# Altium footprint library HDR2.54.PcbLib: 242 footprints (part 16 of 16)
Each footprint in its own frame and in the unit in brackets; x right, y up, seen from the top. Pads: shape width x height; smd on the part's side, far side on the other; paste and mask are expansions set on the pad; w line width, h text height; cw(c..) or ccw(c..) is an arc to the next point about the centre after c.
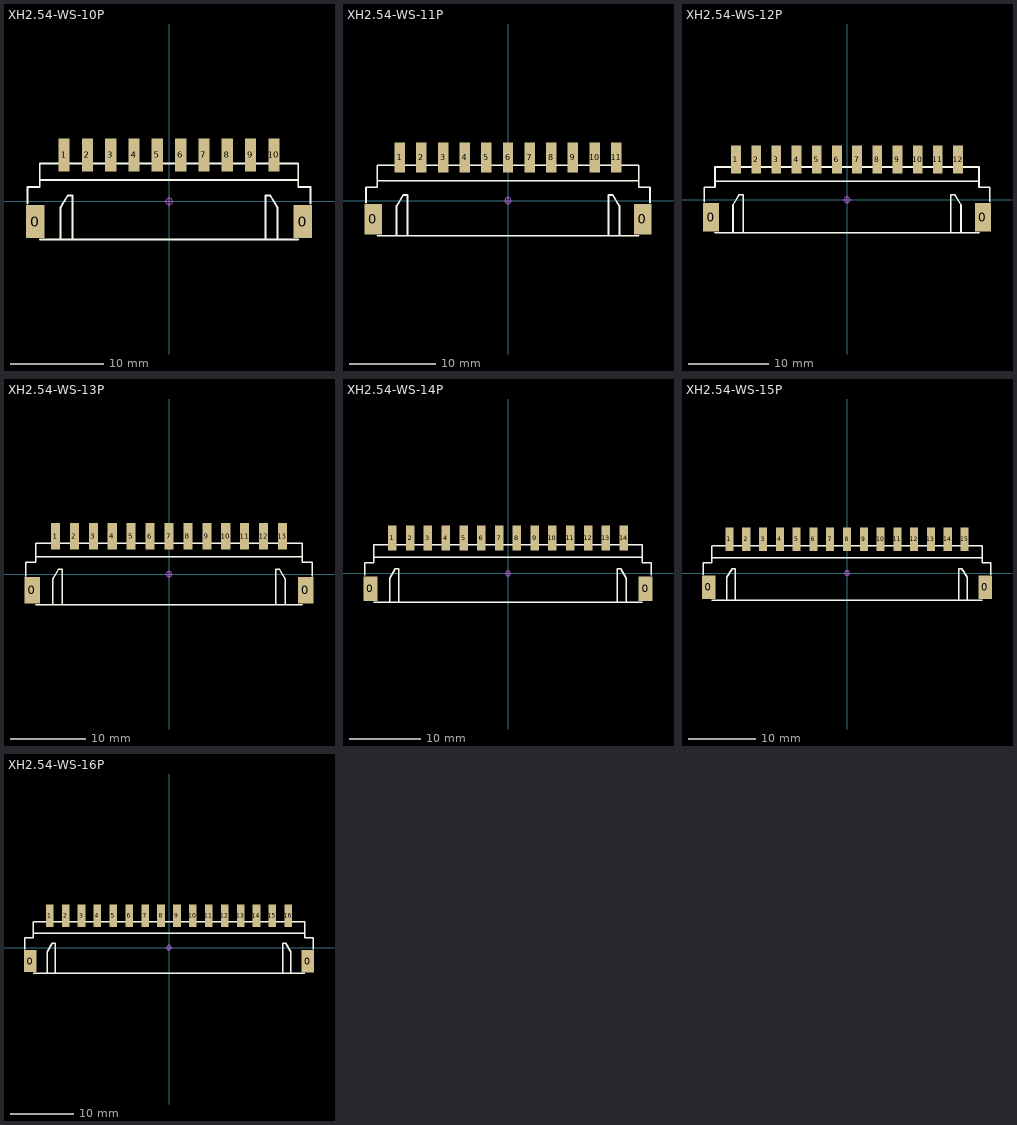
[diagram p15: the footprints below, top view; thin cyan lines are the x and y axes]

## XH2.54-WS-10P [mm] "����30mm�����8mm���ߣ�6.1mm"
pads (12):
  rect 2x3.5 smd: 0(-14.327,-2.15) 0(14.327,-2.15)
  rect 1.2x3.5 smd: 1(-11.25,4.981) 2(-8.75,4.981) 3(-6.25,4.981) 4(-3.75,4.981) 5(-1.25,4.981) 6(1.25,4.981) 7(3.75,4.981) 8(6.25,4.981) 9(8.75,4.981) 10(11.25,4.981)
Top Overlay:
  lines w0.2: -15.16,-0.254 -15.16,1.536 -13.85,1.536 -13.85,4.064 13.85,4.064 13.85,1.536 15.16,1.536 15.16,-0.254 ; -13.85,-4.064 13.85,-4.064 ; -13.85,2.286 13.85,2.286 ; -11.62,-4.064 -11.62,-0.634 -10.858,0.636 -10.35,0.636 -10.35,-4.064 ; 10.35,-4.064 10.35,0.636 10.858,0.636 11.62,-0.634 11.62,-4.064
Mechanical 15:
  circle w0.05: c0,0 r0.35
  lines w0.05: -0.5,0 0.5,0 ; 0,-0.5 0,0.5
3D body "XH2.54-WS-10P.STEP": height 6.05, standoff -0.01, extent -15,-4 15,6.418

## XH2.54-WS-11P [mm] "����32.5mm�����8mm���ߣ�6.1mm"
pads (13):
  rect 2x3.5 smd: 0(-15.577,-2.15) 0(15.577,-2.15)
  rect 1.2x3.5 smd: 1(-12.5,4.981) 2(-10,4.981) 3(-7.5,4.981) 4(-5,4.981) 5(-2.5,4.981) 6(0,4.981) 7(2.5,4.981) 8(5,4.981) 9(7.5,4.981) 10(10,4.981) 11(12.5,4.981)
Top Overlay:
  lines w0.2: -16.41,-0.254 -16.41,1.536 -15.1,1.536 -15.1,4.064 15.1,4.064 15.1,1.536 16.41,1.536 16.41,-0.254 ; -15.1,-4.064 15.1,-4.064 ; -15.1,2.286 15.1,2.286 ; -12.87,-4.064 -12.87,-0.634 -12.108,0.636 -11.6,0.636 -11.6,-4.064 ; 11.6,-4.064 11.6,0.636 12.108,0.636 12.87,-0.634 12.87,-4.064
Mechanical 15:
  circle w0.05: c0,0 r0.35
  lines w0.05: -0.5,0 0.5,0 ; 0,-0.5 0,0.5
3D body "XH2.54-WS-11P.STEP": height 6.05, standoff -0.01, extent -16.25,-4 16.25,6.418

## XH2.54-WS-12P [mm] "����35mm�����8mm���ߣ�6.1mm"
pads (14):
  rect 2x3.5 smd: 0(-16.827,-2.15) 0(16.827,-2.15)
  rect 1.2x3.5 smd: 1(-13.75,4.981) 2(-11.25,4.981) 3(-8.75,4.981) 4(-6.25,4.981) 5(-3.75,4.981) 6(-1.25,4.981) 7(1.25,4.981) 8(3.75,4.981) 9(6.25,4.981) 10(8.75,4.981) 11(11.25,4.981) 12(13.75,4.981)
Top Overlay:
  lines w0.2: -17.66,-0.254 -17.66,1.536 -16.35,1.536 -16.35,4.064 16.35,4.064 16.35,1.536 17.66,1.536 17.66,-0.254 ; -16.35,-4.064 16.35,-4.064 ; -16.35,2.286 16.35,2.286 ; -14.12,-4.064 -14.12,-0.634 -13.358,0.636 -12.85,0.636 -12.85,-4.064 ; 12.85,-4.064 12.85,0.636 13.358,0.636 14.12,-0.634 14.12,-4.064
Mechanical 15:
  circle w0.05: c0,0 r0.35
  lines w0.05: -0.5,0 0.5,0 ; 0,-0.5 0,0.5
3D body "XH2.54-WS-12.P.STEP": height 6.05, standoff -0.01, extent -17.5,-4 17.5,6.418

## XH2.54-WS-13P [mm] "����37.5mm�����8mm���ߣ�6.1mm"
pads (15):
  rect 2x3.5 smd: 0(-18.077,-2.15) 0(18.077,-2.15)
  rect 1.2x3.5 smd: 1(-15,4.981) 2(-12.5,4.981) 3(-10,4.981) 4(-7.5,4.981) 5(-5,4.981) 6(-2.5,4.981) 7(0,4.981) 8(2.5,4.981) 9(5,4.981) 10(7.5,4.981) 11(10,4.981) 12(12.5,4.981) 13(15,4.981)
Top Overlay:
  lines w0.2: -18.91,-0.254 -18.91,1.536 -17.6,1.536 -17.6,4.064 17.6,4.064 17.6,1.536 18.91,1.536 18.91,-0.254 ; -17.6,-4.064 17.6,-4.064 ; -17.6,2.286 17.6,2.286 ; -15.37,-4.064 -15.37,-0.634 -14.608,0.636 -14.1,0.636 -14.1,-4.064 ; 14.1,-4.064 14.1,0.636 14.608,0.636 15.37,-0.634 15.37,-4.064
Mechanical 15:
  circle w0.05: c0,0 r0.35
  lines w0.05: -0.5,0 0.5,0 ; 0,-0.5 0,0.5
3D body "XH2.54-WS-13.P.STEP": height 6.05, standoff -0.01, extent -18.75,-4 18.75,6.418

## XH2.54-WS-14P [mm] "����40mm�����8mm���ߣ�6.1mm"
pads (16):
  rect 2x3.5 smd: 0(-19.327,-2.15) 0(19.327,-2.15)
  rect 1.2x3.5 smd: 1(-16.25,4.981) 2(-13.75,4.981) 3(-11.25,4.981) 4(-8.75,4.981) 5(-6.25,4.981) 6(-3.75,4.981) 7(-1.25,4.981) 8(1.25,4.981) 9(3.75,4.981) 10(6.25,4.981) 11(8.75,4.981) 12(11.25,4.981) 13(13.75,4.981) 14(16.25,4.981)
Top Overlay:
  lines w0.2: -20.16,-0.254 -20.16,1.536 -18.85,1.536 -18.85,4.064 18.85,4.064 18.85,1.536 20.16,1.536 20.16,-0.254 ; -18.85,-4.064 18.85,-4.064 ; -18.85,2.286 18.85,2.286 ; -16.62,-4.064 -16.62,-0.634 -15.858,0.636 -15.35,0.636 -15.35,-4.064 ; 15.35,-4.064 15.35,0.636 15.858,0.636 16.62,-0.634 16.62,-4.064
Mechanical 15:
  circle w0.05: c0,0 r0.35
  lines w0.05: -0.5,0 0.5,0 ; 0,-0.5 0,0.5
3D body "XH2.54-WS-14.P.STEP": height 6.05, standoff -0.01, extent -20,-4 20,6.418

## XH2.54-WS-15P [mm] "����42.5mm�����8mm���ߣ�6.1mm �Ա�ID:�ƾ���ʯ   ������ַ:https://shop463601444.taobao.com"
pads (17):
  rect 2x3.5 smd: 0(-20.577,-2.131) 0(20.577,-2.15)
  rect 1.2x3.5 smd: 1(-17.5,5) 2(-15,5) 3(-12.5,5) 4(-10,5) 5(-7.5,5) 6(-5,5) 7(-2.5,5) 8(0,5) 9(2.5,5) 10(5,5) 11(7.5,5) 12(10,5) 13(12.5,5) 14(15,5) 15(17.5,5)
Top Overlay:
  lines w0.2: -21.41,-0.254 -21.41,1.536 -20.1,1.536 -20.1,4.064 ; -20.1,-4.064 20.1,-4.064 ; -20.1,2.286 20.1,2.286 ; -20,4.064 20.1,4.064 20.1,1.536 21.41,1.536 21.41,-0.254 ; -17.87,-4.064 -17.87,-0.634 -17.108,0.636 -16.6,0.636 -16.6,-4.064 ; 16.6,-4.064 16.6,0.636 17.108,0.636 17.87,-0.634 17.87,-4.064
Mechanical 15:
  circle w0.05: c0,0 r0.35
  lines w0.05: -0.5,0 0.5,0 ; 0,-0.5 0,0.5
3D body "XH2.54-WS-15.P.STEP": height 6.05, standoff -0.01, extent -21.25,-4 21.25,6.418

## XH2.54-WS-16P [mm] "����45mm�����8mm���ߣ�6.1mm �Ա�ID:�ƾ���ʯ   ������ַ:https://shop463601444.taobao.com"
pads (18):
  rect 2x3.5 smd: 0(-21.827,-2.131) 0(21.827,-2.15)
  rect 1.2x3.5 smd: 1(-18.75,5) 2(-16.25,5) 3(-13.75,5) 4(-11.25,5) 5(-8.75,5) 6(-6.25,5) 7(-3.75,5) 8(-1.25,5) 9(1.25,5) 10(3.75,5) 11(6.25,5) 12(8.75,5) 13(11.25,5) 14(13.75,5) 15(16.25,5) 16(18.75,5)
Top Overlay:
  lines w0.2: -22.66,-0.254 -22.66,1.536 -21.35,1.536 -21.35,4.064 ; -21.35,-4.064 21.35,-4.064 ; -21.35,2.286 21.35,2.286 ; -21.25,4.064 21.35,4.064 21.35,1.536 22.66,1.536 22.66,-0.254 ; -19.12,-4.064 -19.12,-0.634 -18.358,0.636 -17.85,0.636 -17.85,-4.064 ; 17.85,-4.064 17.85,0.636 18.358,0.636 19.12,-0.634 19.12,-4.064
Mechanical 15:
  circle w0.05: c0,0 r0.35
  lines w0.05: -0.5,0 0.5,0 ; 0,-0.5 0,0.5
3D body "XH2.54-WS-16.P.STEP": height 6.05, standoff -0.01, extent -22.5,-4 22.5,6.418